# Altium footprint library PcbLibUltimate (1).pcblib: 202 footprints (part 2 of 13)
Each footprint in its own frame and in the unit in brackets; x right, y up, seen from the top. Pads: shape width x height; smd on the part's side, far side on the other; paste and mask are expansions set on the pad; w line width, h text height; cw(c..) or ccw(c..) is an arc to the next point about the centre after c.
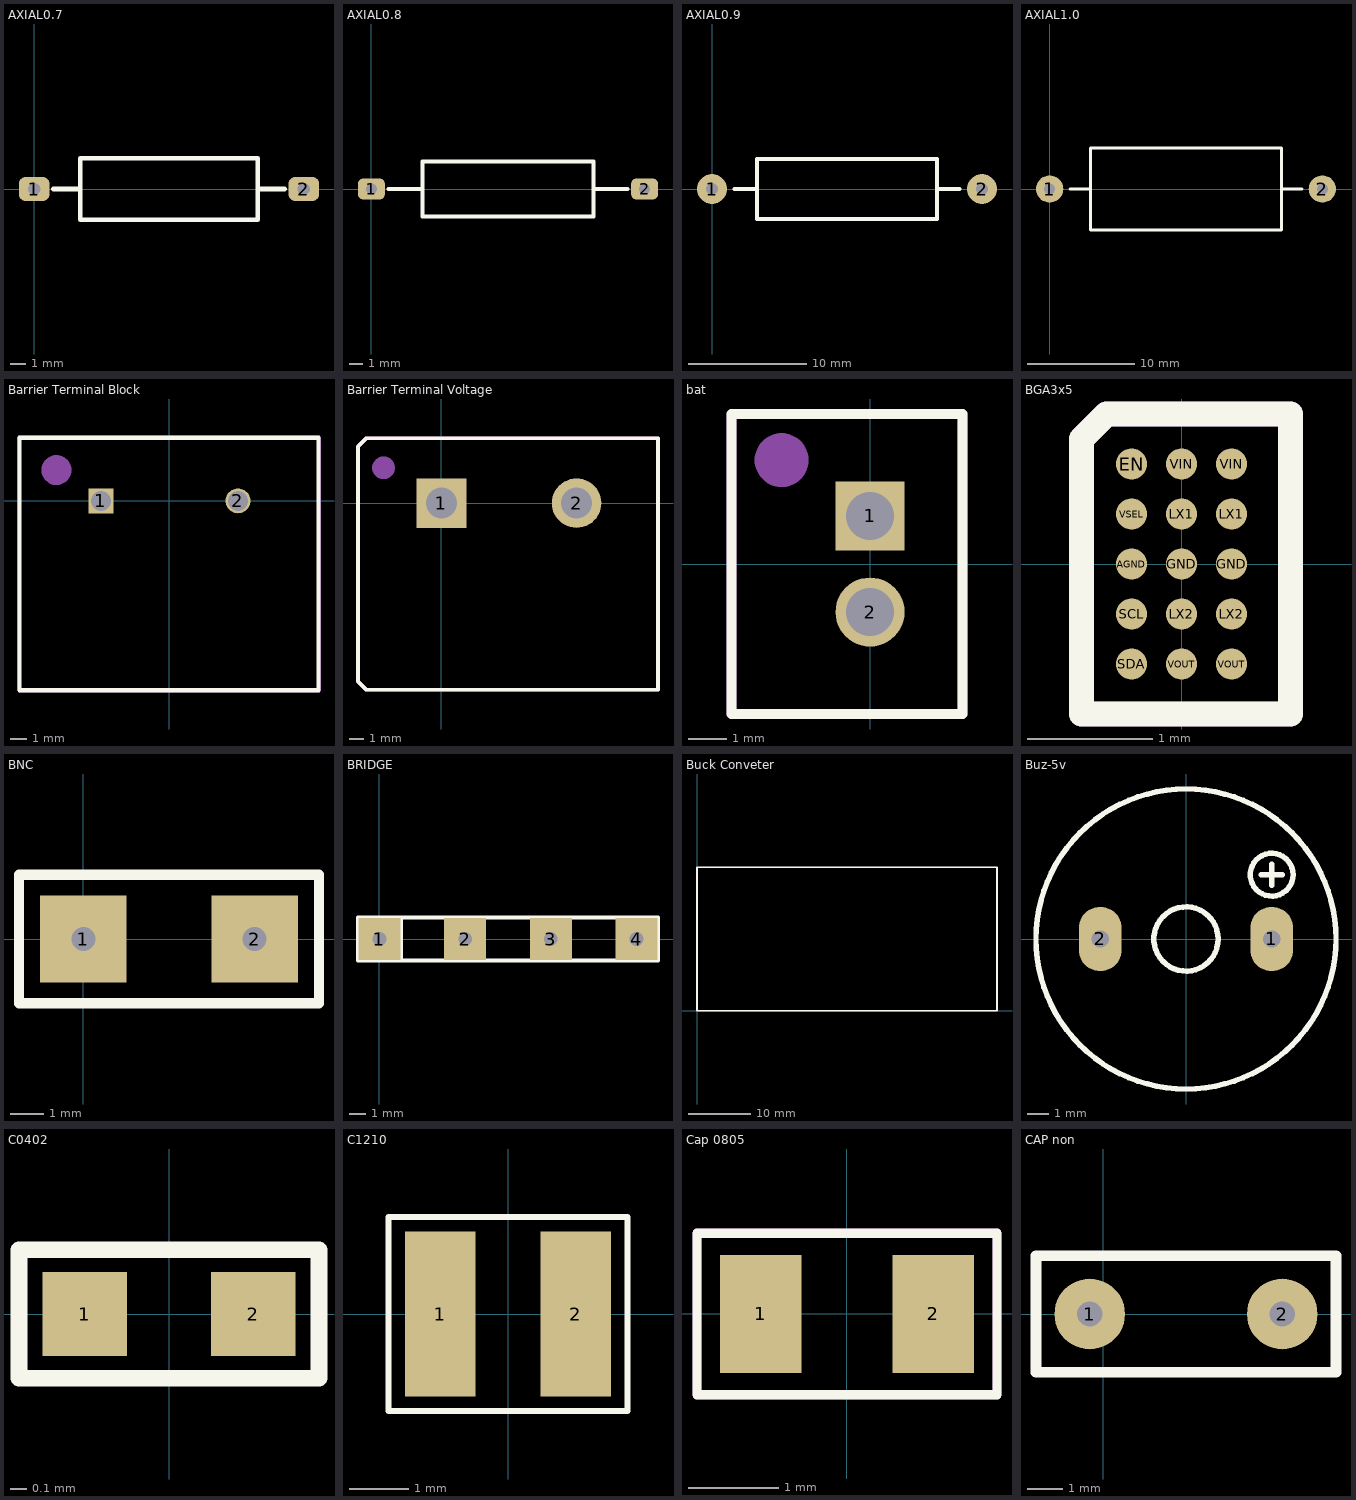
[diagram p1: the footprints below, top view; thin cyan lines are the x and y axes]

## AXIAL0.7 [mil]
pads (2):
  rrect50% 78.74x62 hole 32: 1(0,0) 2(700,0)
Top Overlay:
  lines w12: 50,0 120,0 ; 580,0 650,0 ; 120,-80 580,-80 580,80 120,80 120,-80

## AXIAL0.8 [mil]
pads (2):
  rrect50% 78.74x62 hole 32: 1(0,0) 2(800,0)
Top Overlay:
  lines w12: 50,0 150,0 ; 650,0 750,0 ; 150,-80 150,80 650,80 650,-80 150,-80

## AXIAL0.9 [mil]
pads (2):
  round 100 hole 40: 1(0,0) 2(900,0)
Top Overlay:
  lines w12: 75,0 150,0 ; 750,0 825,0 ; 150,-100 750,-100 750,100 150,100 150,-100

## AXIAL1.0 [mil]
pads (2):
  round 100 hole 40: 1(0,0) 2(1000,0)
Top Overlay:
  lines w12: 75,0 150,0 ; 850,0 925,0 ; 150,-150 850,-150 850,150 150,150 150,-150

## Barrier Terminal Block [mm]
pads (2):
  rect 1.5x1.5 hole 1.2: 1(-4.125,0)
  round 1.5 hole 1.2: 2(4.125,0)
Top Overlay:
  lines w0.254: -9.025,-11.4 8.975,-11.4 8.975,3.8 -9.025,3.8 -9.025,0 -9.025,-11.4
Mechanical 2:
  circle w1: c-6.8,1.85 r0.4
  lines w0.254: -9.05,-11.35 -9.05,3.8 9,3.8 9,-11.4 -9,-11.4
  text ".Designator" at -2.9,-4.8 h2
3D body: height 12.7, standoff 0, extent -9.05,-11.5 8.9,3.7
3D body: height 0.25, standoff -23.04, extent -3.3,-4.8 -3.3,-4.8

## Barrier Terminal Voltage [mm]
pads (2):
  rect 3.5x3.5 hole 2.2: 1(0,0)
  round 3.5 hole 2.2: 2(9.55,0)
Top Overlay:
  lines w0.254: -5.9,-12.6 -5.3,-13.2 15.3,-13.2 15.3,4.6 -5.3,4.6 -5.9,4 -5.9,-12.6
Mechanical 2:
  circle w1: c-4.1,2.5 r0.3
  lines w0.254: -5.9,-12.6 -5.9,4 -5.3,4.6 15.3,4.6 15.3,-13.2 -5.3,-13.2 -5.9,-12.6 ; -5.9,-12.6 -5.9,-12.6
  text ".Designator" at 3.15,-5.25 h2.2
3D body "c-1546833-2-d-3d.stp": height 17.31, standoff -4.99, extent -5.715,-12.5 14.315,4

## bat [mm]
pads (2):
  rect 1.8x1.8 hole 1.25: 1(0,1.25)
  round 1.8 hole 1.25: 2(0,-1.25)
Top Overlay:
  lines w0.254: -3.6,-3.9 -3.6,3.9 2.4,3.9 2.4,-3.9 -3.6,-3.9
Mechanical 2:
  circle w1: c-2.3,2.7 r0.2
  lines w0.254: -3.6,-3.9 2.4,-3.9 2.4,3.9 -3.6,3.9 -3.6,-3.9
  text ".Designator" at -1.3,3.4 h2
3D body "User Library-JST B2B-XH-A.step": height 7.01, standoff -3.39, extent -3.475,-3.7 2.275,3.7
3D body "Li-I ??????????? 4200 ???.STEP": height 54.85, standoff -53, extent -25.508,-1.27 62.592,4.43

## BGA3x5 [mm]
pads (15):
  round 0.25 smd mask+0.015: AGND(-0.4,0) EN(-0.4,0.8) GND(0,0) GND(0.4,0) LX1(0,0.4) LX1(0.4,0.4) LX2(0,-0.4) LX2(0.4,-0.4) SCL(-0.4,-0.4) SDA(-0.4,-0.8) VIN(0,0.8) VIN(0.4,0.8) VOUT(0,-0.8) VOUT(0.4,-0.8) VSEL(-0.4,0.4)
Top Overlay:
  lines w0.2: -0.8,-1.2 0.87,-1.2 0.87,1.2 -0.6,1.2 -0.8,1 -0.8,-1.2
Mechanical 2:
  text "'.Designator'" at 0.635,-1.778 h1
Mechanical 13:
  lines w0.2: -0.8,-1.2 -0.8,1 -0.6,1.2 0.87,1.2 0.87,-1.2 -0.8,-1.2
3D body "User Library-DSBGA15-YFF0015.step": height 0.54, standoff 0, extent -0.672,-1.127 0.672,1.128

## BNC [mil]
pads (2):
  rect 101.37x101.37 hole 28: 1(0,0) 2(200,0)
Top Overlay:
  lines w12: -75,-75 -75,75 275,75 275,-75 -75,-75

## BRIDGE [mm]
pads (4):
  rect 2.5x2.5 hole 0.813: 1(0,0) 2(5.08,0) 3(10.16,0) 4(15.24,0)
Top Overlay:
  lines w0.254: 1.27,-1.27 1.27,1.27 ; -1.27,-1.27 16.51,-1.27 16.51,1.27 -1.27,1.27 -1.27,-1.27

## Buck Conveter [mil]
Top Overlay:
  lines w10: 0,0 1889.76,0 1889.76,905.51 0,905.51 0,0
3D body "User Library-LM2596_DC-DC_CONVERTER.STEP": height 512.71, standoff -31.01, extent 0,0 1889.77,905.51
3D body: height 39.37, standoff -834.65, extent -551.18,984.25 -551.18,984.25
3D body: height 39.37, standoff -834.65, extent -196.85,1102.36 -196.85,1102.36
3D body: height 39.37, standoff -834.65, extent 39.37,-118.11 39.37,-118.11
3D body: height 39.37, standoff -834.65, extent 1299.21,944.88 1299.21,944.88
3D body: height 39.37, standoff -834.65, extent 1299.21,905.51 1299.21,905.51
3D body: height 39.37, standoff -834.65, extent 1299.21,866.14 1299.21,866.14

## Buz-5v [mm]
pads (2):
  oval 2x3 hole 0.813: 1(4,0) 2(-4,0)
Top Overlay:
  circle w0.254: c4,3 r1
  circle w0.254: c0,0 r1.5
  circle w0.254: c0,0 r7
  lines w0.254: 3.5,3 4.5,3 ; 4,2.5 4,3.5
3D body "User Library-CEP2242_Buzzer.STEP": height 7.59, standoff -5.5, extent -6.845,-6.845 6.845,6.845

## C0402 [mm]
pads (2):
  rect 0.5x0.5 smd: 1(-0.5,0) 2(0.5,0)
Top Overlay:
  lines w0.1: -0.889,-0.381 0.889,-0.381 0.889,0.381 -0.889,0.381 -0.889,-0.381
3D body "csmd-0402_l1_w0-5_h0-5.stp": height 0.47, standoff -0.03, extent -0.5,-0.254 0.5,0.246

## C1210 [mm]
pads (2):
  rect 1.2x2.8 smd: 1(-1.15,0) 2(1.15,0)
Top Overlay:
  lines w0.1: -2.032,-1.651 -2.032,1.651 2.032,1.651 2.032,-1.651 -2.032,-1.651
3D body "csmd-1210_l3-2_w2-5_h0-94.stp": height 0.94, standoff 0, extent -1.6,-1.25 1.6,1.25

## Cap 0805 [mm]
pads (2):
  rect 0.9x1.3 smd: 1(-0.95,0) 2(0.95,0)
Top Overlay:
  lines w0.1: -1.651,-0.889 -1.651,0.889 1.651,0.889 1.651,-0.889 -1.651,-0.889
Mechanical 29:
  lines w0.1: -1.651,-0.889 -1.651,0.889 1.651,0.889 1.651,-0.889 -1.651,-0.889
3D body "CAPC2012X145N EIA 0805.step": height 1.53, standoff 0.08, extent -1,-0.6 1,0.6

## CAP non [mm]
pads (2):
  round 2 hole 0.711: 1(-0.381,0) 2(5.08,0)
Top Overlay:
  lines w0.305: -1.905,-1.651 6.604,-1.651 6.604,1.651 -1.905,1.651 -1.905,-1.651
Mechanical 2:
  lines w0.254: -1.905,-1.651 -1.905,1.651 6.604,1.651 6.604,-1.651 -1.905,-1.651
  text ".Designator" at 1.016,-0.508 h1.52
3D body "User Library-Ceramic Capacitors(K104K15X7RF5TH5).step": height 7.28, standoff -2.92, extent -0.587,-1.3 5.413,1.3